# Altium footprint library LQFP.PcbLib: 36 footprints (part 3 of 3)
Each footprint in its own frame and in the unit in brackets; x right, y up, seen from the top. Pads: shape width x height; smd on the part's side, far side on the other; paste and mask are expansions set on the pad; w line width, h text height; cw(c..) or ccw(c..) is an arc to the next point about the centre after c.
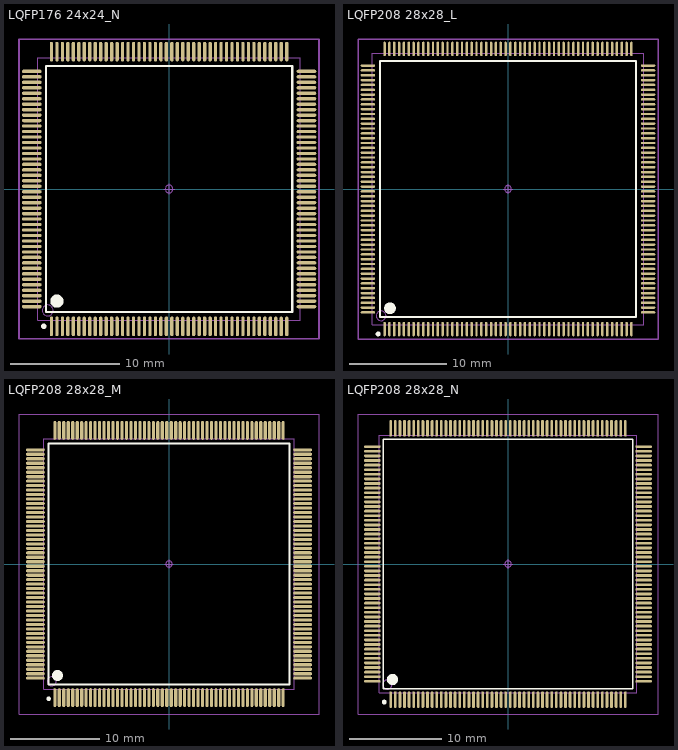
[diagram p2: the footprints below, top view; thin cyan lines are the x and y axes]

## LQFP176 24x24_N [mm] "176脚，体宽24x24mm，脚距0.5mm"
height 1.6
pads (176):
  oval 0.3x1.8 smd: 1(-10.75,-12.55) 2(-10.25,-12.55) 3(-9.75,-12.55) 4(-9.25,-12.55) 5(-8.75,-12.55) 6(-8.25,-12.55) 7(-7.75,-12.55) 8(-7.25,-12.55) 9(-6.75,-12.55) 10(-6.25,-12.55) 11(-5.75,-12.55) 12(-5.25,-12.55) 13(-4.75,-12.55) 14(-4.25,-12.55) 15(-3.75,-12.55) 16(-3.25,-12.55) 17(-2.75,-12.55) 18(-2.25,-12.55) 19(-1.75,-12.55) 20(-1.25,-12.55) 21(-0.75,-12.55) 22(-0.25,-12.55) 23(0.25,-12.55) 24(0.75,-12.55) 25(1.25,-12.55) 26(1.75,-12.55) 27(2.25,-12.55) 28(2.75,-12.55) 29(3.25,-12.55) 30(3.75,-12.55) 31(4.25,-12.55) 32(4.75,-12.55) 33(5.25,-12.55) 34(5.75,-12.55) 35(6.25,-12.55) 36(6.75,-12.55) 37(7.25,-12.55) 38(7.75,-12.55) 39(8.25,-12.55) 40(8.75,-12.55) 41(9.25,-12.55) 42(9.75,-12.55) 43(10.25,-12.55) 44(10.75,-12.55) 89(10.75,12.55) 90(10.25,12.55) 91(9.75,12.55) 92(9.25,12.55) 93(8.75,12.55) 94(8.25,12.55) 95(7.75,12.55) 96(7.25,12.55) 97(6.75,12.55) 98(6.25,12.55) 99(5.75,12.55) 100(5.25,12.55) 101(4.75,12.55) 102(4.25,12.55) 103(3.75,12.55) 104(3.25,12.55) 105(2.75,12.55) 106(2.25,12.55) 107(1.75,12.55) 108(1.25,12.55) 109(0.75,12.55) 110(0.25,12.55) 111(-0.25,12.55) 112(-0.75,12.55) 113(-1.25,12.55) 114(-1.75,12.55) 115(-2.25,12.55) 116(-2.75,12.55) 117(-3.25,12.55) 118(-3.75,12.55) 119(-4.25,12.55) 120(-4.75,12.55) 121(-5.25,12.55) 122(-5.75,12.55) 123(-6.25,12.55) 124(-6.75,12.55) 125(-7.25,12.55) 126(-7.75,12.55) 127(-8.25,12.55) 128(-8.75,12.55) 129(-9.25,12.55) 130(-9.75,12.55) 131(-10.25,12.55) 132(-10.75,12.55)
  oval 1.8x0.3 smd: 45(12.55,-10.75) 46(12.55,-10.25) 47(12.55,-9.75) 48(12.55,-9.25) 49(12.55,-8.75) 50(12.55,-8.25) 51(12.55,-7.75) 52(12.55,-7.25) 53(12.55,-6.75) 54(12.55,-6.25) 55(12.55,-5.75) 56(12.55,-5.25) 57(12.55,-4.75) 58(12.55,-4.25) 59(12.55,-3.75) 60(12.55,-3.25) 61(12.55,-2.75) 62(12.55,-2.25) 63(12.55,-1.75) 64(12.55,-1.25) 65(12.55,-0.75) 66(12.55,-0.25) 67(12.55,0.25) 68(12.55,0.75) 69(12.55,1.25) 70(12.55,1.75) 71(12.55,2.25) 72(12.55,2.75) 73(12.55,3.25) 74(12.55,3.75) 75(12.55,4.25) 76(12.55,4.75) 77(12.55,5.25) 78(12.55,5.75) 79(12.55,6.25) 80(12.55,6.75) 81(12.55,7.25) 82(12.55,7.75) 83(12.55,8.25) 84(12.55,8.75) 85(12.55,9.25) 86(12.55,9.75) 87(12.55,10.25) 88(12.55,10.75) 133(-12.55,10.75) 134(-12.55,10.25) 135(-12.55,9.75) 136(-12.55,9.25) 137(-12.55,8.75) 138(-12.55,8.25) 139(-12.55,7.75) 140(-12.55,7.25) 141(-12.55,6.75) 142(-12.55,6.25) 143(-12.55,5.75) 144(-12.55,5.25) 145(-12.55,4.75) 146(-12.55,4.25) 147(-12.55,3.75) 148(-12.55,3.25) 149(-12.55,2.75) 150(-12.55,2.25) 151(-12.55,1.75) 152(-12.55,1.25) 153(-12.55,0.75) 154(-12.55,0.25) 155(-12.55,-0.25) 156(-12.55,-0.75) 157(-12.55,-1.25) 158(-12.55,-1.75) 159(-12.55,-2.25) 160(-12.55,-2.75) 161(-12.55,-3.25) 162(-12.55,-3.75) 163(-12.55,-4.25) 164(-12.55,-4.75) 165(-12.55,-5.25) 166(-12.55,-5.75) 167(-12.55,-6.25) 168(-12.55,-6.75) 169(-12.55,-7.25) 170(-12.55,-7.75) 171(-12.55,-8.25) 172(-12.55,-8.75) 173(-12.55,-9.25) 174(-12.55,-9.75) 175(-12.55,-10.25) 176(-12.55,-10.75)
Top Overlay:
  circle w0.6: c-10.25,-10.25 r0.3
  circle w0.25: c-11.45,-12.55 r0.125
  lines w0.2: -11.25,-11.25 -11.25,11.25 11.25,11.25 11.25,-11.25 -11.25,-11.25
Mechanical 13:
  circle w0.1: c-11.1,-11.1 r0.5
  lines w0.1: -12,-12 -12,12 12,12 12,-12 -12,-12
Mechanical 15:
  circle w0.05: c0,0 r0.35
  lines w0.05: -0.5,0 0.5,0 ; 0,-0.5 0,0.5
  lines w0.15: -13.716,-13.7 -13.716,13.7 13.7,13.7 13.7,-13.7 -13.716,-13.7
3D body: height 1.45, standoff 0, extent -13,-13 13,13

## LQFP208 28x28_L [mm] "208脚，体宽28x28mm，脚距0.5mm"
height 4.3
pads (208):
  oval 0.25x1.5 smd: 1(-12.75,-14.467) 2(-12.25,-14.467) 3(-11.75,-14.467) 4(-11.25,-14.467) 5(-10.75,-14.467) 6(-10.25,-14.467) 7(-9.75,-14.467) 8(-9.25,-14.467) 9(-8.75,-14.467) 10(-8.25,-14.467) 11(-7.75,-14.467) 12(-7.25,-14.467) 13(-6.75,-14.467) 14(-6.25,-14.467) 15(-5.75,-14.467) 16(-5.25,-14.467) 17(-4.75,-14.467) 18(-4.25,-14.467) 19(-3.75,-14.467) 20(-3.25,-14.467) 21(-2.75,-14.467) 22(-2.25,-14.467) 23(-1.75,-14.467) 24(-1.25,-14.467) 25(-0.75,-14.467) 26(-0.25,-14.467) 27(0.25,-14.467) 28(0.75,-14.467) 29(1.25,-14.467) 30(1.75,-14.467) 31(2.25,-14.467) 32(2.75,-14.467) 33(3.25,-14.467) 34(3.75,-14.467) 35(4.25,-14.467) 36(4.75,-14.467) 37(5.25,-14.467) 38(5.75,-14.467) 39(6.25,-14.467) 40(6.75,-14.467) 41(7.25,-14.467) 42(7.75,-14.467) 43(8.25,-14.467) 44(8.75,-14.467) 45(9.25,-14.467) 46(9.75,-14.467) 47(10.25,-14.467) 48(10.75,-14.467) 49(11.25,-14.467) 50(11.75,-14.467) 51(12.25,-14.467) 52(12.75,-14.467) 105(12.75,14.467) 106(12.25,14.467) 107(11.75,14.467) 108(11.25,14.467) 109(10.75,14.467) 110(10.25,14.467) 111(9.75,14.467) 112(9.25,14.467) 113(8.75,14.467) 114(8.25,14.467) 115(7.75,14.467) 116(7.25,14.467) 117(6.75,14.467) 118(6.25,14.467) 119(5.75,14.467) 120(5.25,14.467) 121(4.75,14.467) 122(4.25,14.467) 123(3.75,14.467) 124(3.25,14.467) 125(2.75,14.467) 126(2.25,14.467) 127(1.75,14.467) 128(1.25,14.467) 129(0.75,14.467) 130(0.25,14.467) 131(-0.25,14.467) 132(-0.75,14.467) 133(-1.25,14.467) 134(-1.75,14.467) 135(-2.25,14.467) 136(-2.75,14.467) 137(-3.25,14.467) 138(-3.75,14.467) 139(-4.25,14.467) 140(-4.75,14.467) 141(-5.25,14.467) 142(-5.75,14.467) 143(-6.25,14.467) 144(-6.75,14.467) 145(-7.25,14.467) 146(-7.75,14.467) 147(-8.25,14.467) 148(-8.75,14.467) 149(-9.25,14.467) 150(-9.75,14.467) 151(-10.25,14.467) 152(-10.75,14.467) 153(-11.25,14.467) 154(-11.75,14.467) 155(-12.25,14.467) 156(-12.75,14.467)
  oval 1.5x0.25 smd: 53(14.467,-12.75) 54(14.467,-12.25) 55(14.467,-11.75) 56(14.467,-11.25) 57(14.467,-10.75) 58(14.467,-10.25) 59(14.467,-9.75) 60(14.467,-9.25) 61(14.467,-8.75) 62(14.467,-8.25) 63(14.467,-7.75) 64(14.467,-7.25) 65(14.467,-6.75) 66(14.467,-6.25) 67(14.467,-5.75) 68(14.467,-5.25) 69(14.467,-4.75) 70(14.467,-4.25) 71(14.467,-3.75) 72(14.467,-3.25) 73(14.467,-2.75) 74(14.467,-2.25) 75(14.467,-1.75) 76(14.467,-1.25) 77(14.467,-0.75) 78(14.467,-0.25) 79(14.467,0.25) 80(14.467,0.75) 81(14.467,1.25) 82(14.467,1.75) 83(14.467,2.25) 84(14.467,2.75) 85(14.467,3.25) 86(14.467,3.75) 87(14.467,4.25) 88(14.467,4.75) 89(14.467,5.25) 90(14.467,5.75) 91(14.467,6.25) 92(14.467,6.75) 93(14.467,7.25) 94(14.467,7.75) 95(14.467,8.25) 96(14.467,8.75) 97(14.467,9.25) 98(14.467,9.75) 99(14.467,10.25) 100(14.467,10.75) 101(14.467,11.25) 102(14.467,11.75) 103(14.467,12.25) 104(14.467,12.75) 157(-14.467,12.75) 158(-14.467,12.25) 159(-14.467,11.75) 160(-14.467,11.25) 161(-14.467,10.75) 162(-14.467,10.25) 163(-14.467,9.75) 164(-14.467,9.25) 165(-14.467,8.75) 166(-14.467,8.25) 167(-14.467,7.75) 168(-14.467,7.25) 169(-14.467,6.75) 170(-14.467,6.25) 171(-14.467,5.75) 172(-14.467,5.25) 173(-14.467,4.75) 174(-14.467,4.25) 175(-14.467,3.75) 176(-14.467,3.25) 177(-14.467,2.75) 178(-14.467,2.25) 179(-14.467,1.75) 180(-14.467,1.25) 181(-14.467,0.75) 182(-14.467,0.25) 183(-14.467,-0.25) 184(-14.467,-0.75) 185(-14.467,-1.25) 186(-14.467,-1.75) 187(-14.467,-2.25) 188(-14.467,-2.75) 189(-14.467,-3.25) 190(-14.467,-3.75) 191(-14.467,-4.25) 192(-14.467,-4.75) 193(-14.467,-5.25) 194(-14.467,-5.75) 195(-14.467,-6.25) 196(-14.467,-6.75) 197(-14.467,-7.25) 198(-14.467,-7.75) 199(-14.467,-8.25) 200(-14.467,-8.75) 201(-14.467,-9.25) 202(-14.467,-9.75) 203(-14.467,-10.25) 204(-14.467,-10.75) 205(-14.467,-11.25) 206(-14.467,-11.75) 207(-14.467,-12.25) 208(-14.467,-12.75)
Top Overlay:
  circle w0.6: c-12.192,-12.319 r0.3
  circle w0.25: c-13.425,-14.975 r0.125
  lines w0.2: -13.208,-13.208 -13.208,13.208 13.208,13.208 13.208,-13.208 -13.208,-13.208
Mechanical 13:
  circle w0.1: c-13.1,-13.1 r0.5
  lines w0.1: -14,-14 -14,14 14,14 14,-14 -14,-14
Mechanical 15:
  circle w0.05: c0,0 r0.35
  lines w0.05: -0.5,0 0.5,0 ; 0,-0.5 0,0.5
  lines w0.15: -15.494,-15.494 -15.494,15.494 15.494,15.494 15.494,-15.494 -15.494,-15.494
3D body: height 1.45, standoff 0, extent -15,-15 15,15

## LQFP208 28x28_M [mm] "208脚，体宽28x28mm，脚距0.5mm"
height 4.3
pads (208):
  oval 0.35x2.1 smd: 1(-12.75,-14.923) 2(-12.25,-14.923) 3(-11.75,-14.923) 4(-11.25,-14.923) 5(-10.75,-14.923) 6(-10.25,-14.923) 7(-9.75,-14.923) 8(-9.25,-14.923) 9(-8.75,-14.923) 10(-8.25,-14.923) 11(-7.75,-14.923) 12(-7.25,-14.923) 13(-6.75,-14.923) 14(-6.25,-14.923) 15(-5.75,-14.923) 16(-5.25,-14.923) 17(-4.75,-14.923) 18(-4.25,-14.923) 19(-3.75,-14.923) 20(-3.25,-14.923) 21(-2.75,-14.923) 22(-2.25,-14.923) 23(-1.75,-14.923) 24(-1.25,-14.923) 25(-0.75,-14.923) 26(-0.25,-14.923) 27(0.25,-14.923) 28(0.75,-14.923) 29(1.25,-14.923) 30(1.75,-14.923) 31(2.25,-14.923) 32(2.75,-14.923) 33(3.25,-14.923) 34(3.75,-14.923) 35(4.25,-14.923) 36(4.75,-14.923) 37(5.25,-14.923) 38(5.75,-14.923) 39(6.25,-14.923) 40(6.75,-14.923) 41(7.25,-14.923) 42(7.75,-14.923) 43(8.25,-14.923) 44(8.75,-14.923) 45(9.25,-14.923) 46(9.75,-14.923) 47(10.25,-14.923) 48(10.75,-14.923) 49(11.25,-14.923) 50(11.75,-14.923) 51(12.25,-14.923) 52(12.75,-14.923) 105(12.75,14.923) 106(12.25,14.923) 107(11.75,14.923) 108(11.25,14.923) 109(10.75,14.923) 110(10.25,14.923) 111(9.75,14.923) 112(9.25,14.923) 113(8.75,14.923) 114(8.25,14.923) 115(7.75,14.923) 116(7.25,14.923) 117(6.75,14.923) 118(6.25,14.923) 119(5.75,14.923) 120(5.25,14.923) 121(4.75,14.923) 122(4.25,14.923) 123(3.75,14.923) 124(3.25,14.923) 125(2.75,14.923) 126(2.25,14.923) 127(1.75,14.923) 128(1.25,14.923) 129(0.75,14.923) 130(0.25,14.923) 131(-0.25,14.923) 132(-0.75,14.923) 133(-1.25,14.923) 134(-1.75,14.923) 135(-2.25,14.923) 136(-2.75,14.923) 137(-3.25,14.923) 138(-3.75,14.923) 139(-4.25,14.923) 140(-4.75,14.923) 141(-5.25,14.923) 142(-5.75,14.923) 143(-6.25,14.923) 144(-6.75,14.923) 145(-7.25,14.923) 146(-7.75,14.923) 147(-8.25,14.923) 148(-8.75,14.923) 149(-9.25,14.923) 150(-9.75,14.923) 151(-10.25,14.923) 152(-10.75,14.923) 153(-11.25,14.923) 154(-11.75,14.923) 155(-12.25,14.923) 156(-12.75,14.923)
  oval 2.1x0.35 smd: 53(14.923,-12.75) 54(14.923,-12.25) 55(14.923,-11.75) 56(14.923,-11.25) 57(14.923,-10.75) 58(14.923,-10.25) 59(14.923,-9.75) 60(14.923,-9.25) 61(14.923,-8.75) 62(14.923,-8.25) 63(14.923,-7.75) 64(14.923,-7.25) 65(14.923,-6.75) 66(14.923,-6.25) 67(14.923,-5.75) 68(14.923,-5.25) 69(14.923,-4.75) 70(14.923,-4.25) 71(14.923,-3.75) 72(14.923,-3.25) 73(14.923,-2.75) 74(14.923,-2.25) 75(14.923,-1.75) 76(14.923,-1.25) 77(14.923,-0.75) 78(14.923,-0.25) 79(14.923,0.25) 80(14.923,0.75) 81(14.923,1.25) 82(14.923,1.75) 83(14.923,2.25) 84(14.923,2.75) 85(14.923,3.25) 86(14.923,3.75) 87(14.923,4.25) 88(14.923,4.75) 89(14.923,5.25) 90(14.923,5.75) 91(14.923,6.25) 92(14.923,6.75) 93(14.923,7.25) 94(14.923,7.75) 95(14.923,8.25) 96(14.923,8.75) 97(14.923,9.25) 98(14.923,9.75) 99(14.923,10.25) 100(14.923,10.75) 101(14.923,11.25) 102(14.923,11.75) 103(14.923,12.25) 104(14.923,12.75) 157(-14.923,12.75) 158(-14.923,12.25) 159(-14.923,11.75) 160(-14.923,11.25) 161(-14.923,10.75) 162(-14.923,10.25) 163(-14.923,9.75) 164(-14.923,9.25) 165(-14.923,8.75) 166(-14.923,8.25) 167(-14.923,7.75) 168(-14.923,7.25) 169(-14.923,6.75) 170(-14.923,6.25) 171(-14.923,5.75) 172(-14.923,5.25) 173(-14.923,4.75) 174(-14.923,4.25) 175(-14.923,3.75) 176(-14.923,3.25) 177(-14.923,2.75) 178(-14.923,2.25) 179(-14.923,1.75) 180(-14.923,1.25) 181(-14.923,0.75) 182(-14.923,0.25) 183(-14.923,-0.25) 184(-14.923,-0.75) 185(-14.923,-1.25) 186(-14.923,-1.75) 187(-14.923,-2.25) 188(-14.923,-2.75) 189(-14.923,-3.25) 190(-14.923,-3.75) 191(-14.923,-4.25) 192(-14.923,-4.75) 193(-14.923,-5.25) 194(-14.923,-5.75) 195(-14.923,-6.25) 196(-14.923,-6.75) 197(-14.923,-7.25) 198(-14.923,-7.75) 199(-14.923,-8.25) 200(-14.923,-8.75) 201(-14.923,-9.25) 202(-14.923,-9.75) 203(-14.923,-10.25) 204(-14.923,-10.75) 205(-14.923,-11.25) 206(-14.923,-11.75) 207(-14.923,-12.25) 208(-14.923,-12.75)
Top Overlay:
  circle w0.25: c-13.45,-15.05 r0.125
  circle w0.6: c-12.45,-12.45 r0.3
  lines w0.2: -13.45,-13.45 13.45,-13.45 13.45,13.45 -13.45,13.45 -13.45,-13.45
Mechanical 13:
  circle w0.1: c-13.1,-13.1 r0.5
  lines w0.1: -14,-14 -14,14 14,14 14,-14 -14,-14
Mechanical 15:
  circle w0.05: c0,0 r0.35
  lines w0.05: -0.5,0 0.5,0 ; 0,-0.5 0,0.5
  lines w0.1: -16.75,-16.75 16.75,-16.75 16.75,16.75 -16.75,16.75 -16.75,-16.75
3D body: height 1.45, standoff 0, extent -15,-15 15,15

## LQFP208 28x28_N [mm] "208脚，体宽28x28mm，脚距0.5mm"
height 4.3
pads (208):
  oval 0.3x1.8 smd: 1(-12.75,-14.746) 2(-12.25,-14.746) 3(-11.75,-14.746) 4(-11.25,-14.746) 5(-10.75,-14.746) 6(-10.25,-14.746) 7(-9.75,-14.746) 8(-9.25,-14.746) 9(-8.75,-14.746) 10(-8.25,-14.746) 11(-7.75,-14.746) 12(-7.25,-14.746) 13(-6.75,-14.746) 14(-6.25,-14.746) 15(-5.75,-14.746) 16(-5.25,-14.746) 17(-4.75,-14.746) 18(-4.25,-14.746) 19(-3.75,-14.746) 20(-3.25,-14.746) 21(-2.75,-14.746) 22(-2.25,-14.746) 23(-1.75,-14.746) 24(-1.25,-14.746) 25(-0.75,-14.746) 26(-0.25,-14.746) 27(0.25,-14.746) 28(0.75,-14.746) 29(1.25,-14.746) 30(1.75,-14.746) 31(2.25,-14.746) 32(2.75,-14.746) 33(3.25,-14.746) 34(3.75,-14.746) 35(4.25,-14.746) 36(4.75,-14.746) 37(5.25,-14.746) 38(5.75,-14.746) 39(6.25,-14.746) 40(6.75,-14.746) 41(7.25,-14.746) 42(7.75,-14.746) 43(8.25,-14.746) 44(8.75,-14.746) 45(9.25,-14.746) 46(9.75,-14.746) 47(10.25,-14.746) 48(10.75,-14.746) 49(11.25,-14.746) 50(11.75,-14.746) 51(12.25,-14.746) 52(12.75,-14.746) 105(12.75,14.746) 106(12.25,14.746) 107(11.75,14.746) 108(11.25,14.746) 109(10.75,14.746) 110(10.25,14.746) 111(9.75,14.746) 112(9.25,14.746) 113(8.75,14.746) 114(8.25,14.746) 115(7.75,14.746) 116(7.25,14.746) 117(6.75,14.746) 118(6.25,14.746) 119(5.75,14.746) 120(5.25,14.746) 121(4.75,14.746) 122(4.25,14.746) 123(3.75,14.746) 124(3.25,14.746) 125(2.75,14.746) 126(2.25,14.746) 127(1.75,14.746) 128(1.25,14.746) 129(0.75,14.746) 130(0.25,14.746) 131(-0.25,14.746) 132(-0.75,14.746) 133(-1.25,14.746) 134(-1.75,14.746) 135(-2.25,14.746) 136(-2.75,14.746) 137(-3.25,14.746) 138(-3.75,14.746) 139(-4.25,14.746) 140(-4.75,14.746) 141(-5.25,14.746) 142(-5.75,14.746) 143(-6.25,14.746) 144(-6.75,14.746) 145(-7.25,14.746) 146(-7.75,14.746) 147(-8.25,14.746) 148(-8.75,14.746) 149(-9.25,14.746) 150(-9.75,14.746) 151(-10.25,14.746) 152(-10.75,14.746) 153(-11.25,14.746) 154(-11.75,14.746) 155(-12.25,14.746) 156(-12.75,14.746)
  oval 1.8x0.3 smd: 53(14.746,-12.75) 54(14.746,-12.25) 55(14.746,-11.75) 56(14.746,-11.25) 57(14.746,-10.75) 58(14.746,-10.25) 59(14.746,-9.75) 60(14.746,-9.25) 61(14.746,-8.75) 62(14.746,-8.25) 63(14.746,-7.75) 64(14.746,-7.25) 65(14.746,-6.75) 66(14.746,-6.25) 67(14.746,-5.75) 68(14.746,-5.25) 69(14.746,-4.75) 70(14.746,-4.25) 71(14.746,-3.75) 72(14.746,-3.25) 73(14.746,-2.75) 74(14.746,-2.25) 75(14.746,-1.75) 76(14.746,-1.25) 77(14.746,-0.75) 78(14.746,-0.25) 79(14.746,0.25) 80(14.746,0.75) 81(14.746,1.25) 82(14.746,1.75) 83(14.746,2.25) 84(14.746,2.75) 85(14.746,3.25) 86(14.746,3.75) 87(14.746,4.25) 88(14.746,4.75) 89(14.746,5.25) 90(14.746,5.75) 91(14.746,6.25) 92(14.746,6.75) 93(14.746,7.25) 94(14.746,7.75) 95(14.746,8.25) 96(14.746,8.75) 97(14.746,9.25) 98(14.746,9.75) 99(14.746,10.25) 100(14.746,10.75) 101(14.746,11.25) 102(14.746,11.75) 103(14.746,12.25) 104(14.746,12.75) 157(-14.746,12.75) 158(-14.746,12.25) 159(-14.746,11.75) 160(-14.746,11.25) 161(-14.746,10.75) 162(-14.746,10.25) 163(-14.746,9.75) 164(-14.746,9.25) 165(-14.746,8.75) 166(-14.746,8.25) 167(-14.746,7.75) 168(-14.746,7.25) 169(-14.746,6.75) 170(-14.746,6.25) 171(-14.746,5.75) 172(-14.746,5.25) 173(-14.746,4.75) 174(-14.746,4.25) 175(-14.746,3.75) 176(-14.746,3.25) 177(-14.746,2.75) 178(-14.746,2.25) 179(-14.746,1.75) 180(-14.746,1.25) 181(-14.746,0.75) 182(-14.746,0.25) 183(-14.746,-0.25) 184(-14.746,-0.75) 185(-14.746,-1.25) 186(-14.746,-1.75) 187(-14.746,-2.25) 188(-14.746,-2.75) 189(-14.746,-3.25) 190(-14.746,-3.75) 191(-14.746,-4.25) 192(-14.746,-4.75) 193(-14.746,-5.25) 194(-14.746,-5.75) 195(-14.746,-6.25) 196(-14.746,-6.75) 197(-14.746,-7.25) 198(-14.746,-7.75) 199(-14.746,-8.25) 200(-14.746,-8.75) 201(-14.746,-9.25) 202(-14.746,-9.75) 203(-14.746,-10.25) 204(-14.746,-10.75) 205(-14.746,-11.25) 206(-14.746,-11.75) 207(-14.746,-12.25) 208(-14.746,-12.75)
Top Overlay:
  circle w0.6: c-12.55,-12.55 r0.3
  circle w0.25: c-13.45,-15 r0.125
  lines w0.2: -13.55,-13.55 -13.55,13.55 13.55,13.55 13.55,-13.55 -13.55,-13.55
Mechanical 13:
  circle w0.1: c-13.1,-13.1 r0.5
  lines w0.1: -14,-14 14,-14 14,14 -14,14 -14,-14
Mechanical 15:
  circle w0.05: c0,0 r0.35
  lines w0.05: -0.5,0 0.5,0 ; 0,-0.5 0,0.5
  lines w0.1: -16.3,-16.3 -16.3,16.3 16.3,16.3 16.3,-16.3 -16.3,-16.3
3D body: height 1.45, standoff 0, extent -15,-15 15,15